# Altium footprint library Supernova Connectors.PcbLib: 303 footprints (part 8 of 19)
Each footprint in its own frame and in the unit in brackets; x right, y up, seen from the top. Pads: shape width x height; smd on the part's side, far side on the other; paste and mask are expansions set on the pad; w line width, h text height; cw(c..) or ccw(c..) is an arc to the next point about the centre after c.
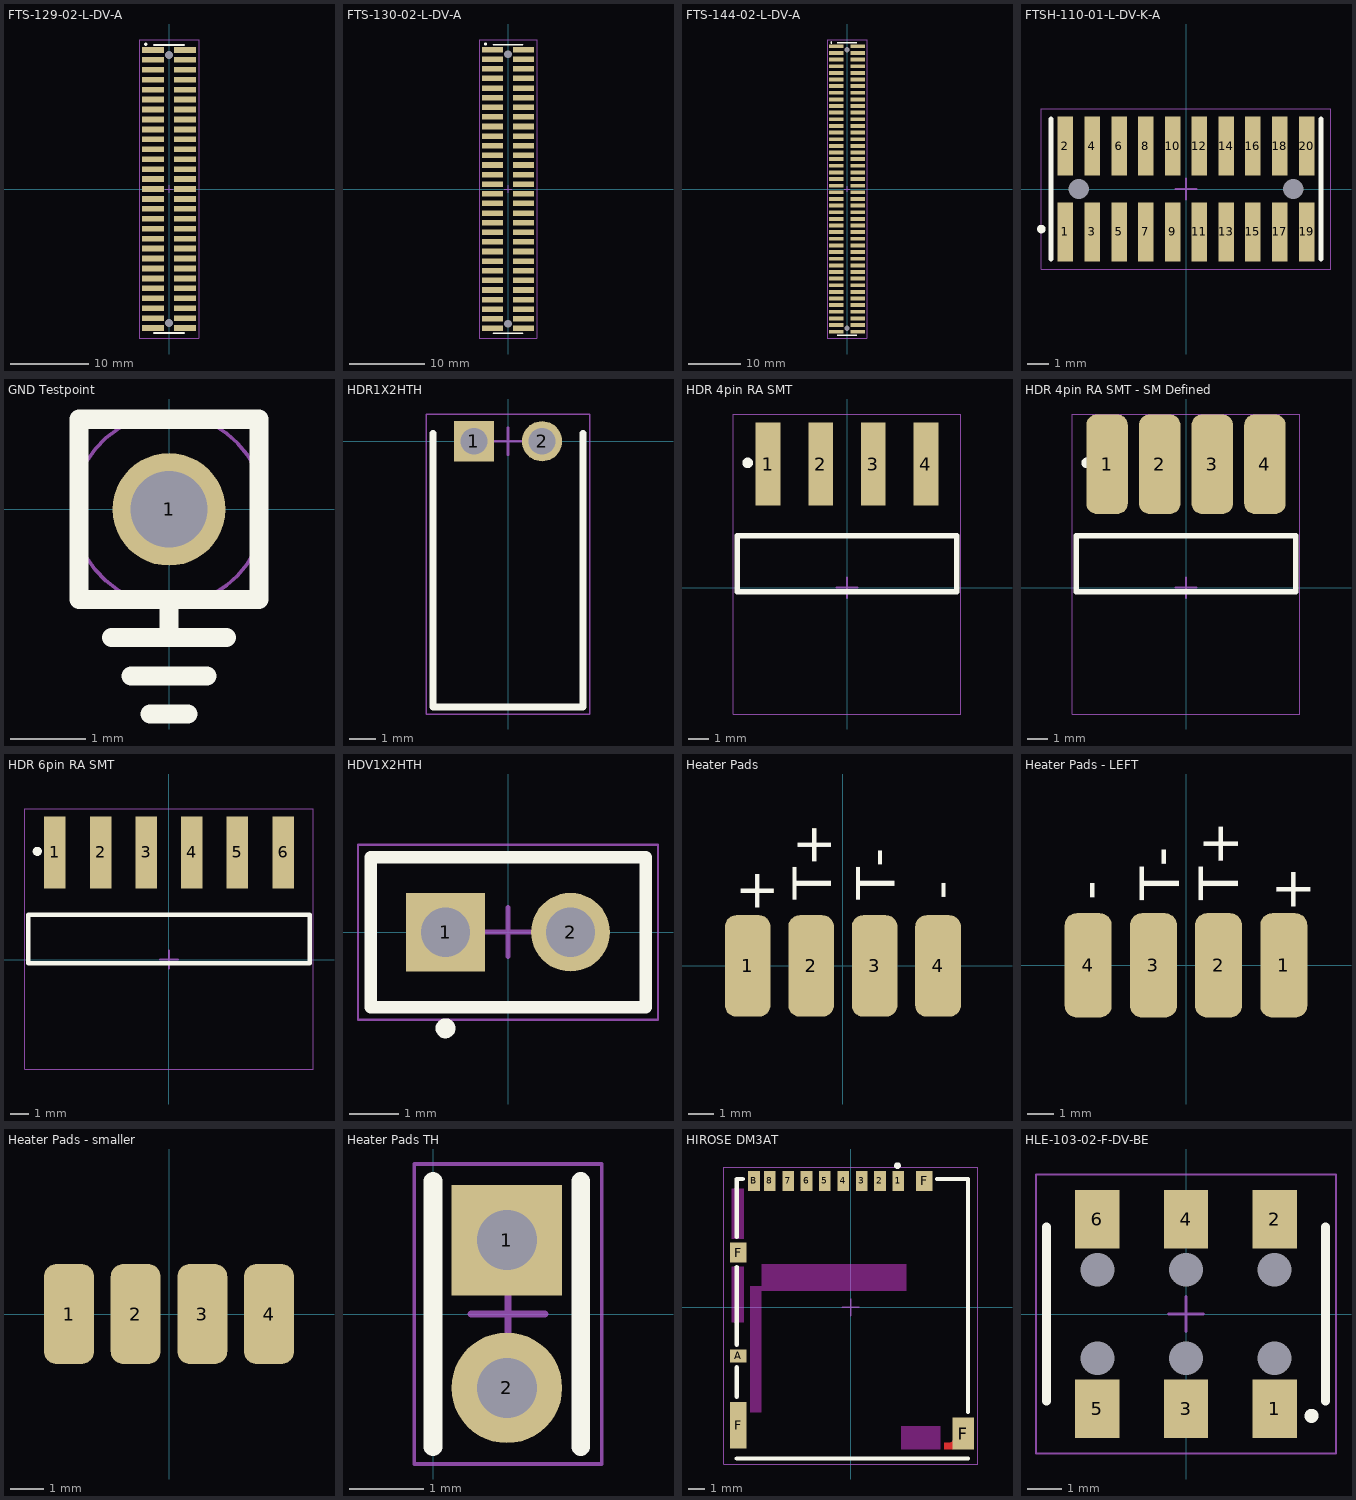
[diagram p7: the footprints below, top view; thin cyan lines are the x and y axes]

## FTS-129-02-L-DV-A [mil]
pads (60):
  rect 110x29 smd: 1(-80,700) 2(80,700) 3(-80,650) 4(80,650) 5(-80,600) 6(80,600) 7(-80,550) 8(80,550) 9(-80,500) 10(80,500) 11(-80,450) 12(80,450) 13(-80,400) 14(80,400) 15(-80,350) 16(80,350) 17(-80,300) 18(80,300) 19(-80,250) 20(80,250) 21(-80,200) 22(80,200) 23(-80,150) 24(80,150) 25(-80,100) 26(80,100) 27(-80,50) 28(80,50) 29(-80,0) 30(80,0) 31(-80,-50) 32(80,-50) 33(-80,-100) 34(80,-100) 35(-80,-150) 36(80,-150) 37(-80,-200) 38(80,-200) 39(-80,-250) 40(80,-250) 41(-80,-300) 42(80,-300) 43(-80,-350) 44(80,-350) 45(-80,-400) 46(80,-400) 47(-80,-450) 48(80,-450) 49(-80,-500) 50(80,-500) 51(-80,-550) 52(80,-550) 53(-80,-600) 54(80,-600) 55(-80,-650) 56(80,-650) 57(-80,-700) 58(80,-700)
  round 20 hole 40 unplated: ""(0,-675) ""(0,675)
Top Overlay:
  circle w8: c-117.2,728.44 r4
  lines w10: -75,-725 75,-725 ; -75,725 75,725
Top Courtyard:
  lines w1.97: -150,-750 -150,750 150,750 150,-750 -150,-750
  lines w3.94: -19.68,0 19.69,0 ; 0,-19.68 0,19.69
3D body "FTS-129-02-L-DV-A.stp": height 124, standoff -35, extent -115.01,-724.99 114.99,725.01

## FTS-130-02-L-DV-A [mil]
pads (62):
  rect 110x29 smd: 1(-80,725) 2(80,725) 3(-80,675) 4(80,675) 5(-80,625) 6(80,625) 7(-80,575) 8(80,575) 9(-80,525) 10(80,525) 11(-80,475) 12(80,475) 13(-80,425) 14(80,425) 15(-80,375) 16(80,375) 17(-80,325) 18(80,325) 19(-80,275) 20(80,275) 21(-80,225) 22(80,225) 23(-80,175) 24(80,175) 25(-80,125) 26(80,125) 27(-80,75) 28(80,75) 29(-80,25) 30(80,25) 31(-80,-25) 32(80,-25) 33(-80,-75) 34(80,-75) 35(-80,-125) 36(80,-125) 37(-80,-175) 38(80,-175) 39(-80,-225) 40(80,-225) 41(-80,-275) 42(80,-275) 43(-80,-325) 44(80,-325) 45(-80,-375) 46(80,-375) 47(-80,-425) 48(80,-425) 49(-80,-475) 50(80,-475) 51(-80,-525) 52(80,-525) 53(-80,-575) 54(80,-575) 55(-80,-625) 56(80,-625) 57(-80,-675) 58(80,-675) 59(-80,-725) 60(80,-725)
  round 20 hole 40 unplated: ""(0,-700) ""(0,700)
Top Overlay:
  circle w8: c-117.2,753.44 r4
  lines w10: -75,-750 75,-750 ; -75,750 75,750
Top Courtyard:
  lines w1.97: -150,-775 150,-775 150,775 -150,775 -150,-775
  lines w3.94: -19.68,-0.59 19.69,-0.59 ; 0,-20.28 0,19.09
3D body "FTS-130-02-L-DV-A.stp": height 124, standoff -35, extent -115,-750.58 115,749.42

## FTS-144-02-L-DV-A [mil]
pads (90):
  rect 110x29 smd: 1(-80,1075) 2(82,1075) 3(-80,1025) 4(82,1025) 5(-80,975) 6(82,975) 7(-80,925) 8(82,925) 9(-80,875) 10(82,875) 11(-80,825) 12(82,825) 13(-80,775) 14(82,775) 15(-80,725) 16(82,725) 17(-80,675) 18(82,675) 19(-80,625) 20(82,625) 21(-80,575) 22(82,575) 23(-80,525) 24(82,525) 25(-80,475) 26(82,475) 27(-80,425) 28(82,425) 29(-80,375) 30(82,375) 31(-80,325) 32(82,325) 33(-80,275) 34(82,275) 35(-80,225) 36(82,225) 37(-80,175) 38(82,175) 39(-80,125) 40(82,125) 41(-80,75) 42(82,75) 43(-80,25) 44(82,25) 45(-80,-25) 46(82,-25) 47(-80,-75) 48(82,-75) 49(-80,-125) 50(82,-125) 51(-80,-175) 52(82,-175) 53(-80,-225) 54(82,-225) 55(-80,-275) 56(82,-275) 57(-80,-325) 58(82,-325) 59(-80,-375) 60(82,-375) 61(-80,-425) 62(82,-425) 63(-80,-475) 64(82,-475) 65(-80,-525) 66(82,-525) 67(-80,-575) 68(82,-575) 69(-80,-625) 70(82,-625) 71(-80,-675) 72(82,-675) 73(-80,-725) 74(82,-725) 75(-80,-775) 76(82,-775) 77(-80,-825) 78(82,-825) 79(-80,-875) 80(82,-875) 81(-80,-925) 82(82,-925) 83(-80,-975) 84(82,-975) 85(-80,-1025) 86(82,-1025) 87(-80,-1075) 88(82,-1075)
  round 20 hole 40 unplated: ""(0,-1050) ""(0,1050)
Top Overlay:
  circle w8: c-117.2,1103.44 r4
  lines w10: -75,-1100 75,-1100 ; -75,1100 75,1100
Top Courtyard:
  lines w1.97: -150,-1125 150,-1125 150,1125 -150,1125 -150,-1125
  lines w3.94: -19.68,0 19.69,0 ; 0,-19.69 0,19.68
3D body "FTS-144-02-L-DV-A.stp": height 124, standoff -35, extent -115,-1100 115,1100

## FTSH-110-01-L-DV-K-A [mil]
pads (22):
  rect 29x110 smd mask+2: 1(-225,-80) 2(-225,80) 3(-175,-80) 4(-175,80) 5(-125,-80) 6(-125,80) 7(-75,-80) 8(-75,80) 9(-25,-80) 10(-25,80) 11(25,-80) 12(25,80) 13(75,-80) 14(75,80) 15(125,-80) 16(125,80) 17(175,-80) 18(175,80) 19(225,-80) 20(225,80)
  round 0 hole 38 unplated: 21(-200,0) 22(200,0)
Top Overlay:
  circle w8: c-270,-74.8 r4
  lines w10: -251.97,-129.92 -251.97,129.92 ; 251.97,-129.92 251.97,129.92
Top Courtyard:
  lines w1.97: -270,-150 -270,150 270,150 270,-150 -270,-150
  lines w3.94: -19.68,0 19.68,0 ; 0,-19.68 0,19.69
3D body "FTSH-110-01-F-DV-K-A.stp": height 242, standoff -33, extent -249.99,-114.99 250.01,115

## GND Testpoint [mm]
pads (1):
  round 1.5 hole 1.02: 1(0,0)
Top Overlay:
  lines w0.254: -0.762,-1.708 0.762,-1.708 ; -0.508,-2.216 0.508,-2.216 ; -0.254,-2.724 0.254,-2.724 ; 0,-1.708 0,-1.2 ; -1.2,-1.2 -1.2,1.2 1.2,1.2 1.2,-1.2 -1.2,-1.2
Top Courtyard:
  circle w0.05: c0,0 r1.27

## HDR1X2HTH [mm] "Connector; Header; 3 Position; Right Angle. Through hole"
pads (2):
  rect 1.5x1.5 hole 1: 1(-1.27,0)
  round 1.5 hole 1: 2(1.27,0)
Top Overlay:
  lines w0.254: -2.794,0.3 -2.794,-9.9 2.794,-9.9 2.794,0.3
Top Courtyard:
  lines w0.05: -3.048,-10.16 -3.048,1.016 3.048,1.016 3.048,-10.16 -3.048,-10.16
  lines w0.1: -0.5,0 0.5,0 ; 0,-0.5 0,0.5
3D body "TSW-102-08-X-S-RA.step": height 3.07, standoff -2.26, extent -2.54,-9.906 2.54,0.317

## HDR 4pin RA SMT [mm]
pads (4):
  rect 1.2x4 smd paste-0.15: 1(-3.81,5.96) 2(-1.27,5.96) 3(1.27,5.96) 4(3.81,5.96)
Top Overlay:
  circle w0.254: c-4.793,6.02 r0.127
  lines w0.254: -5.3,-0.2 5.3,-0.2 5.3,2.5 -5.3,2.5 -5.3,-0.2
Top Courtyard:
  lines w0.05: -5.5,-6.096 5.5,-6.096 5.5,8.382 -5.5,8.382 -5.5,-6.096
  lines w0.1: -0.5,0 0.5,0 ; 0,-0.5 0,0.5
3D body "10060, _ _ C04SBSN-M89.STEP": height 3.56, standoff 0, extent -5.075,-5.852 5.085,7.102

## HDR 4pin RA SMT - SM Defined [mm]
pads (4):
  rrect50% 2x4.8 smd paste-0.4 mask-0.4: 1(-3.81,5.96) 2(-1.27,5.96) 3(1.27,5.96) 4(3.81,5.96)
Top Overlay:
  circle w0.254: c-4.793,6.02 r0.127
  lines w0.254: -5.3,-0.2 5.3,-0.2 5.3,2.5 -5.3,2.5 -5.3,-0.2
Top Courtyard:
  lines w0.05: -5.5,-6.096 5.5,-6.096 5.5,8.382 -5.5,8.382 -5.5,-6.096
  lines w0.1: -0.5,0 0.5,0 ; 0,-0.5 0,0.5
3D body "10060, _ _ C04SBSN-M89.STEP": height 3.56, standoff 0, extent -5.075,-5.852 5.085,7.102

## HDR 6pin RA SMT [mm]
pads (6):
  rect 1.2x4 smd paste-0.15: 1(-6.35,5.96) 2(-3.81,5.96) 3(-1.27,5.96) 4(1.27,5.96) 5(3.81,5.96) 6(6.35,5.96)
Top Overlay:
  circle w0.254: c-7.333,6.02 r0.127
  lines w0.254: -7.84,-0.2 7.84,-0.2 7.84,2.5 -7.84,2.5 -7.84,-0.2
Top Courtyard:
  lines w0.05: -8.04,-6.096 8.04,-6.096 8.04,8.382 -8.04,8.382 -8.04,-6.096
  lines w0.1: -0.5,0 0.5,0 ; 0,-0.5 0,0.5
3D body "10060, _ _ C04SBSN-M89.STEP": height 3.56, standoff 0, extent -7.615,-5.852 2.545,7.102
3D body "10060, _ _ C04SBSN-M89.STEP": height 3.56, standoff 0, extent -2.535,-5.852 7.625,7.102

## HDV1X2HTH [mm] "Connector; Header; 2 Position; Vertical. Through hole"
pads (2):
  rect 1.6x1.6 hole 1: 1(-1.27,0)
  round 1.6 hole 1: 2(1.27,0)
Top Overlay:
  circle w0.203: c-1.27,-1.954 r0.102
  lines w0.254: -2.794,-1.524 2.794,-1.524 2.794,-1.3 2.794,1.524 -2.794,1.524 -2.794,-1.524
Top Courtyard:
  lines w0.05: -3.048,-1.778 -3.048,1.778 3.048,1.778 3.048,-1.778 -3.048,-1.778
  lines w0.1: -0.5,0 0.5,0 ; 0,-0.5 0,0.5
3D body "TSW-102-07-G-S.stp": height 8.38, standoff -2.54, extent -2.667,-1.27 2.54,1.27

## Heater Pads [mm]
pads (4):
  rrect50% 1.8x4 smd paste-2: 1(-3.75,0) 2(-1.25,0) 3(1.25,0) 4(3.75,0)
Top Overlay:
  text "-" at 4.55,2.6 h1.52
  text "T-" at 2.05,2.6 h1.52
  text "T+" at -0.45,2.6 h1.52
  text "+" at -4.25,2.3 h1.52

## Heater Pads - LEFT [mm]
pads (4):
  rrect50% 1.8x4 smd paste-2: 1(3.75,0) 2(1.25,0) 3(-1.25,0) 4(-3.75,0)
Top Overlay:
  text "-" at -3,2.5 h1.52
  text "T-" at -0.25,2.5 h1.52
  text "T+" at 2,2.5 h1.52
  text "+" at 3.25,2.25 h1.52

## Heater Pads - smaller [mm]
pads (4):
  rrect50% 1.5x3 smd paste-2: 1(-3,0) 2(-1,0) 3(1,0) 4(3,0)

## Heater Pads TH [mm]
pads (2):
  rect 1.5x1.5 hole 0.813: 1(1,1)
  round 1.5 hole 0.813: 2(1,-1)
Top Overlay:
  lines w0.254: 0,-1.8 0,1.8 ; 2,-1.8 2,1.8
Top Courtyard:
  lines w0.05: -0.254,-2.032 2.286,-2.032 2.286,2.032 -0.254,2.032 -0.254,-2.032
  lines w0.1: 0.516,0 1.516,0 ; 1.016,-0.5 1.016,0.5

## HIROSE DM3AT [mm]
pads (14):
  rect 0.7x1.2 smd mask+0: 1(2.85,7.575) 2(1.75,7.575) 3(0.65,7.575) 4(-0.45,7.575) 5(-1.55,7.575) 6(-2.65,7.575) 7(-3.75,7.575) 8(-4.85,7.575) B(-5.8,7.575)
  rect 1x0.8 smd mask+0: A(-6.75,-2.925)
  rect 1x2.8 smd paste-0.1 mask+0: F(-6.75,-7.075)
  rect 1x1.2 smd mask+0: F(-6.75,3.275) F(4.4,7.575)
  rect 1.3x1.9 smd paste-0.1 mask+0: F(6.75,-7.575)
Top Layer:
  region: 5.975,-8.125 5.6,-8.125 5.6,-8.525 6.125,-8.525 6.125,-8 6.1,-8
Top Layer keep-out:
  rectangle: -7.15,4.1 -6.4,7.125
  rectangle: -7.15,-0.925 -6.4,2.45
  rectangle: -6.025,-6.325 -5.35,1.275
  rectangle: -5.35,0.975 3.35,2.575
  rectangle: 3,-8.525 5.375,-7.125
Top Overlay:
  circle w0.203: c2.8,8.478 r0.102
  lines w0.254: -6.825,-9.075 7.025,-9.075 ; -6.825,-5.375 -6.825,-3.6 ; -6.825,-2.25 -6.825,2.4 ; -6.825,4.2 -6.825,7.675 -6.475,7.675 ; 5.175,7.675 7.025,7.675 7.025,-6.275
Top Courtyard:
  lines w0.05: -7.62,-9.398 -7.62,8.382 7.62,8.382 7.62,-9.398 -7.62,-9.398
  lines w0.1: -0.5,0 0.5,0 ; 0,-0.5 0,0.5
3D body "DM3AT-SF-PEJM52.STEP": height 1.78, standoff 0.1, extent -6.85,-8.5 7,7.65

## HLE-103-02-F-DV-BE [mm]
pads (12):
  round 0 hole 0.97 unplated: 0(-2.54,-1.27) 0(-2.54,1.27) 0(0,-1.27) 0(0,1.27) 0(2.54,-1.27) 0(2.54,1.27)
  rect 1.27x1.68 smd: 1(2.54,-2.72) 2(2.54,2.72) 3(0,-2.72) 4(0,2.72) 5(-2.54,-2.72) 6(-2.54,2.72)
Top Overlay:
  circle w0.203: c3.6,-2.92 r0.102
  lines w0.254: -4,-2.5 -4,2.5 ; 4,-2.5 4,2.5
Top Courtyard:
  lines w0.05: -4.3,-4 4.3,-4 4.3,4 -4.3,4 -4.3,-4
  lines w0.1: -0.5,0 0.5,0 ; 0,-0.5 0,0.5
3D body "HLE-103-02-F-DV-BE.stp": height 3.66, standoff 0, extent -3.81,-3.289 3.81,3.289